# Altium footprint library Под микроконтроллеры.PcbLib: 24 footprints (part 1 of 2)
Each footprint in its own frame and in the unit in brackets; x right, y up, seen from the top. Pads: shape width x height; smd on the part's side, far side on the other; paste and mask are expansions set on the pad; w line width, h text height; cw(c..) or ccw(c..) is an arc to the next point about the centre after c.
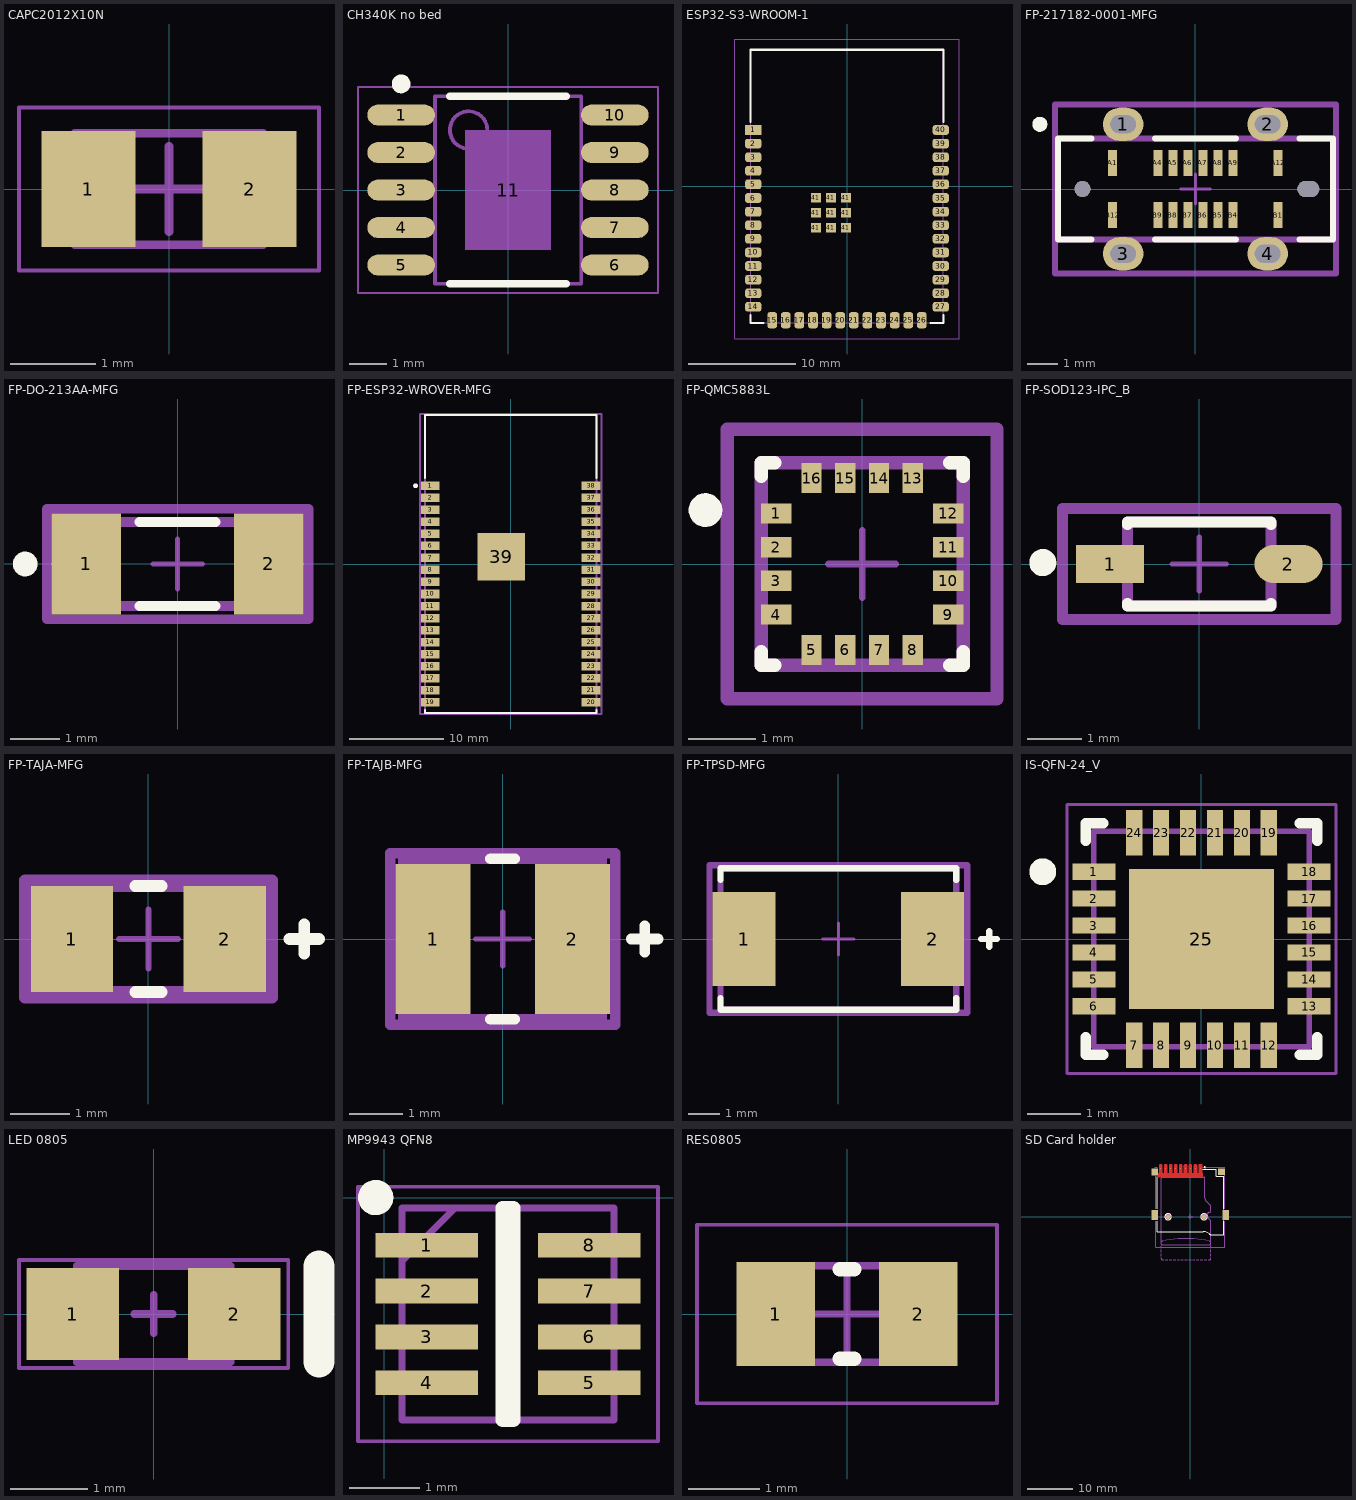
[diagram p0: the footprints below, top view; thin cyan lines are the x and y axes]

## CAPC2012X10N [mm] "Chip Capacitor, 2-Leads, Body 2,05x1,20mm, IPC Medium Density"
height 1
pads (2):
  rect 1.1x1.35 smd: 1(-0.94,0) 2(0.94,0)
Top Assembly:
  lines w0.1: -1.1,-0.65 -1.1,0.65 1.1,0.65 1.1,-0.65 -1.1,-0.65
Top Courtyard:
  lines w0.05: -1.75,-0.95 -1.75,0.95 1.75,0.95 1.75,-0.95 -1.75,-0.95
  lines w0.1: -0.5,0 0.5,0 ; 0,-0.5 0,0.5
3D body "CAPC2012X10N.step": height 1, standoff 0, extent -1.1,-0.65 1.1,0.65

## CH340K no bed [mm] "SOP, 10-Leads, Body 5,00x3,90mm, Pitch 1,00mm, Thermal Pad 3,20x2,30mm, IPC Medium Density"
height 2
pads (11):
  oval 1.8x0.56 smd: 1(-2.85,2) 2(-2.85,1) 3(-2.85,0) 4(-2.85,-1) 5(-2.85,-2) 6(2.85,-2) 7(2.85,-1) 8(2.85,0) 9(2.85,1) 10(2.85,2)
  rect 2.3x3.2 on Mech1: 11(0,0)
Top Overlay:
  circle w0.25: c-2.85,2.83 r0.125
  lines w0.2: -1.55,-2.5 1.55,-2.5 ; -1.55,2.5 1.55,2.5
Top 3D Body:
  circle w0.1: c-1.05,1.6 r0.5
  lines w0.1: -1.95,-2.5 -1.95,2.5 1.95,2.5 1.95,-2.5 -1.95,-2.5
Top Courtyard:
  lines w0.05: -4,-2.75 -4,2.75 4,2.75 4,-2.75 -4,-2.75
  lines w0.1: -0.5,0 0.5,0 ; 0,-0.5 0,0.5
3D body "SOP100P620X200_HS-11N.step": height 2, standoff 0, extent -3.075,-2.5 3.075,2.5

## ESP32-S3-WROOM-1 [mm] "PCB ANTENNA - 41 PIN"
pads (49):
  rect 1.5x0.9 smd: 1(-8.75,5.26)
  rrect50% 1.5x0.9 smd: 2(-8.75,3.99) 3(-8.75,2.72) 4(-8.75,1.45) 5(-8.75,0.18) 6(-8.75,-1.09) 7(-8.75,-2.36) 8(-8.75,-3.63) 9(-8.75,-4.9) 10(-8.75,-6.17) 11(-8.75,-7.44) 12(-8.75,-8.71) 13(-8.75,-9.98) 14(-8.75,-11.25) 27(8.75,-11.25) 28(8.75,-9.98) 29(8.75,-8.71) 30(8.75,-7.44) 31(8.75,-6.17) 32(8.75,-4.9) 33(8.75,-3.63) 34(8.75,-2.36) 35(8.75,-1.09) 36(8.75,0.18) 37(8.75,1.45) 38(8.75,2.72) 39(8.75,3.99) 40(8.75,5.26)
  rrect50% 0.9x1.5 smd: 15(-6.985,-12.5) 16(-5.715,-12.5) 17(-4.445,-12.5) 18(-3.175,-12.5) 19(-1.905,-12.5) 20(-0.635,-12.5) 21(0.635,-12.5) 22(1.905,-12.5) 23(3.175,-12.5) 24(4.445,-12.5) 25(5.715,-12.5) 26(6.985,-12.5)
  rect 0.9x0.9 smd: 41(-2.9,-3.86) 41(-2.9,-2.46) 41(-2.9,-1.06) 41(-1.5,-3.86) 41(-1.5,-2.46) 41(-1.5,-1.06) 41(-0.1,-3.86) 41(-0.1,-2.46) 41(-0.1,-1.06)
Top Overlay:
  lines w0.2: -9,-12 -9,-12.75 -7.8,-12.75 ; -9,6 -9,12.75 9,12.75 9,6 ; 7.8,-12.75 9,-12.75 9,-12
Top 3D Body:
  lines w0.1: -9,-12.75 9,-12.75 9,12.75 -9,12.75 -9,-12.75
Top Courtyard:
  lines w0.1: -10.5,-14.25 10.5,-14.25 10.5,13.75 -10.5,13.75 -10.5,-14.25
3D body "ESP32-S3-WROOM-1.STEP": height 3.1, standoff 0, extent -9,-12.75 9,12.75

## FP-217182-0001-MFG [mm]
pads (22):
  rrect100% 1.35x1.1 hole 0.6 slot 0.85 at 0 deg paste-2539.97 mask+0: 1(-2.4,2.15) 2(2.4,2.15) 3(-2.4,-2.15) 4(2.4,-2.15)
  rect 0.3x0.87 smd paste+0 mask+0: A1(-2.75,0.865) A4(-1.25,0.865) A5(-0.75,0.865) A6(-0.25,0.865) A7(0.25,0.865) A8(0.75,0.865) A9(1.25,0.865) A12(2.75,0.865) B1(2.75,-0.865) B4(1.25,-0.865) B5(0.75,-0.865) B6(0.25,-0.865) B7(-0.25,-0.865) B8(-0.75,-0.865) B9(-1.25,-0.865) B12(-2.75,-0.865)
  round 0.52 hole 0.52 unplated paste-2539.97 mask+0: ""(-3.75,0)
  rrect100% 0.72x0.52 hole 0.52 slot 0.72 at 0 deg unplated paste-2539.97 mask+0: ""(3.75,0)
Top Overlay:
  circle w0.25: c-5.17,2.15 r0.125
  lines w0.2: -3.45,-1.68 -4.57,-1.68 -4.57,1.68 -3.45,1.68 ; -1.35,-1.68 1.35,-1.68 ; -1.35,1.68 1.35,1.68 ; 3.45,-1.68 4.57,-1.68 4.57,1.68 3.45,1.68
Top Assembly:
  lines w0.2: -4.67,-2.8 4.67,-2.8 4.67,2.8 -4.67,2.8 -4.67,-2.8
  text ".Designator" at 0,0.188 h1
Top 3D Body:
  lines w0.2: -4.57,-1.68 4.57,-1.68 4.57,1.68 -4.57,1.68 -4.57,-1.68
Top Courtyard:
  lines w0.2: -4.67,-2.8 4.67,-2.8 4.67,2.8 -4.67,2.8 -4.67,-2.8
Top Component Center:
  lines w0.1: -0.5,0 0.5,0 ; 0,-0.5 0,0.5
3D body "Conn_Molex_217182-0001_eec.STEP": height 0.25, standoff 0, extent -4.67,-2.8 4.67,2.8

## FP-DO-213AA-MFG [mm]
pads (2):
  rect 1.4x2.03 smd paste+0 mask+0: 1(-1.84,0) 2(1.84,0)
Top Overlay:
  circle w0.25: c-3.075,0 r0.125
  lines w0.2: -0.765,-0.85 0.765,-0.85 ; -0.765,0.85 0.765,0.85
Top Assembly:
  lines w0.2: -2.64,-1.115 -2.64,1.115 2.64,1.115 2.64,-1.115 -2.64,-1.115
  text ".Designator" at 0.909,0.642 h1
Top 3D Body:
  lines w0.2: -1.855,-0.85 -1.855,0.85 1.855,0.85 1.855,-0.85 -1.855,-0.85
Top Courtyard:
  lines w0.2: -2.64,-1.115 -2.64,1.115 2.64,1.115 2.64,-1.115 -2.64,-1.115
Top Component Center:
  lines w0.1: -0.5,0 0.5,0 ; 0,-0.5 0,0.5
3D body "Diode_Microchip_JAN1N4148UR-1_eec.STEP": height 0.25, standoff 0, extent -2.64,-1.115 2.64,1.115

## FP-ESP32-WROVER-MFG [mm]
pads (39):
  rect 2x0.9 smd paste+0 mask+0: 1(-8.5,8.26) 2(-8.5,6.99) 3(-8.5,5.72) 4(-8.5,4.45) 5(-8.5,3.18) 6(-8.5,1.91) 7(-8.5,0.64) 8(-8.5,-0.63) 9(-8.5,-1.9) 10(-8.5,-3.17) 11(-8.5,-4.44) 12(-8.5,-5.71) 13(-8.5,-6.98) 14(-8.5,-8.25) 15(-8.5,-9.52) 16(-8.5,-10.79) 17(-8.5,-12.06) 18(-8.5,-13.33) 19(-8.5,-14.6) 20(8.5,-14.6) 21(8.5,-13.33) 22(8.5,-12.06) 23(8.5,-10.79) 24(8.5,-9.52) 25(8.5,-8.25) 26(8.5,-6.98) 27(8.5,-5.71) 28(8.5,-4.44) 29(8.5,-3.17) 30(8.5,-1.9) 31(8.5,-0.63) 32(8.5,0.64) 33(8.5,1.91) 34(8.5,3.18) 35(8.5,4.45) 36(8.5,5.72) 37(8.5,6.99) 38(8.5,8.26)
  rect 5x5 smd paste+0 mask+0: 39(-1,0.76)
Top Overlay:
  circle w0.25: c-10.05,8.26 r0.125
  lines w0.2: -9.05,-15.425 -9.05,-15.75 9.05,-15.75 9.05,-15.425 ; -9.05,9.085 -9.05,15.75 9.05,15.75 9.05,9.085
Top Assembly:
  lines w0.2: -9.6,-15.85 -9.6,15.85 9.6,15.85 9.6,-15.85 -9.6,-15.85
  text ".Designator" at 0,-0.001 h1
Top 3D Body:
  lines w0.2: -9.05,-15.75 -9.05,15.75 9.05,15.75 9.05,-15.75 -9.05,-15.75
Top Courtyard:
  lines w0.2: -9.6,-15.85 -9.6,15.85 9.6,15.85 9.6,-15.85 -9.6,-15.85
Top Component Center:
  lines w0.1: -0.5,0 0.5,0 ; 0,-0.5 0,0.5
3D body "UNK_Espressif_Systems_ESP32-WROVER_eec.STEP": height 0.25, standoff 0, extent -9.6,-15.85 9.6,15.85

## FP-QMC5883L [mm]
pads (16):
  rect 0.45x0.3 smd paste+0 mask+0: 1(-1.275,0.75) 2(-1.275,0.25) 3(-1.275,-0.25) 4(-1.275,-0.75) 9(1.275,-0.75) 10(1.275,-0.25) 11(1.275,0.25) 12(1.275,0.75)
  rect 0.3x0.45 smd paste+0 mask+0: 5(-0.75,-1.275) 6(-0.25,-1.275) 7(0.25,-1.275) 8(0.75,-1.275) 13(0.75,1.275) 14(0.25,1.275) 15(-0.25,1.275) 16(-0.75,1.275)
Top Overlay:
  circle w0.25: c-2.325,0.8 r0.125
  lines w0.2: -1.5,-1.3 -1.5,-1.5 -1.3,-1.5 ; -1.5,1.3 -1.5,1.5 -1.3,1.5 ; 1.3,-1.5 1.5,-1.5 1.5,-1.3 ; 1.3,1.5 1.5,1.5 1.5,1.3
Top Assembly:
  lines w0.2: -2,-2 -2,2 2,2 2,-2 -2,-2
Top 3D Body:
  lines w0.2: -1.5,-1.5 -1.5,1.5 1.5,1.5 1.5,-1.5 -1.5,-1.5
Top Courtyard:
  lines w0.2: -2,-2 -2,2 2,2 2,-2 -2,-2
Top Component Center:
  lines w0.1: -0.5,0 0.5,0 ; 0,-0.5 0,0.5
3D body "IC_Honeywell_HMC5883L-TR_eec.STEP": height 0.9, standoff 0, extent -1.5,-1.5 1.5,1.5

## FP-SOD123-IPC_B [mm]
pads (2):
  rect 1.257x0.702 smd paste+0 mask+0: 1(-1.65,0)
  rrect100% 1.257x0.702 smd paste+0 mask+0: 2(1.65,0)
Top Overlay:
  circle w0.25: c-2.895,0.026 r0.125
  lines w0.2: -1.325,-0.726 -1.325,-0.775 1.325,-0.775 1.325,-0.726 ; -1.325,0.726 -1.325,0.775 1.325,0.775 1.325,0.726
Top Assembly:
  lines w0.2: -2.529,-1.025 2.529,-1.025 2.529,1.025 -2.529,1.025 -2.529,-1.025
  text ".Designator" at 0,0.188 h1
Top 3D Body:
  lines w0.2: -1.325,-0.775 1.325,-0.775 1.325,0.775 -1.325,0.775 -1.325,-0.775
Top Courtyard:
  lines w0.2: -2.529,-1.025 2.529,-1.025 2.529,1.025 -2.529,1.025 -2.529,-1.025
Top Component Center:
  lines w0.1: -0.5,0 0.5,0 ; 0,-0.5 0,0.5
3D body "Diode_Diodes_Inc_MMSZ5245B-7-F_eec.STEP": height 0.25, standoff 0, extent -2.529,-1.025 2.529,1.025

## FP-TAJA-MFG [mm]
height 8.54
pads (2):
  rect 1.4x1.8 smd paste+0 mask+0: 1(-1.3,0) 2(1.3,0)
Top Overlay:
  lines w0.2: -0.225,-0.9 0.225,-0.9 ; -0.225,0.9 0.225,0.9 ; 2.4,0 2.9,0 ; 2.65,-0.25 2.65,0.25
Top Assembly:
  lines w0.2: -2.1,-1 2.1,-1 2.1,1 -2.1,1 -2.1,-1
  text ".Designator" at 0,-0.001 h1
Top 3D Body:
  lines w0.2: -1.7,-0.9 1.7,-0.9 1.7,0.9 -1.7,0.9 -1.7,-0.9
Top Courtyard:
  lines w0.2: -2.1,-1 2.1,-1 2.1,1 -2.1,1 -2.1,-1
Top Component Center:
  lines w0.1: -0.5,0 0.5,0 ; 0,-0.5 0,0.5
3D body "Cap_AVX_TAJA476K002RNJ_eec.STEP": height 0.25, standoff 0, extent -2.1,-1 2.1,1

## FP-TAJB-MFG [mm]
height 8.54
pads (2):
  rect 1.4x2.8 smd paste+0 mask+0: 1(-1.3,0) 2(1.3,0)
Top Overlay:
  lines w0.2: -0.225,-1.5 0.225,-1.5 ; -0.225,1.5 0.225,1.5 ; 2.4,0 2.9,0 ; 2.65,-0.25 2.65,0.25
Top Assembly:
  lines w0.2: -2.1,-1.6 -2.1,1.6 2.1,1.6 2.1,-1.6 -2.1,-1.6
  text ".Designator" at 0,-0.001 h1
Top 3D Body:
  lines w0.2: -1.85,-1.5 -1.85,1.5 1.85,1.5 1.85,-1.5 -1.85,-1.5
Top Courtyard:
  lines w0.2: -2.1,-1.6 -2.1,1.6 2.1,1.6 2.1,-1.6 -2.1,-1.6
Top Component Center:
  lines w0.1: -0.5,0 0.5,0 ; 0,-0.5 0,0.5
3D body "Cap_AVX_TAJB335M035RNJ_eec.STEP": height 0.25, standoff 0, extent -2.1,-1.6 2.1,1.6

## FP-TPSD-MFG [mm]
pads (2):
  rect 2x3 smd paste+0 mask+0: 1(-3,0) 2(3,0)
Top Overlay:
  lines w0.2: -3.75,-1.875 -3.75,-2.25 3.75,-2.25 3.75,-1.875 ; -3.75,1.875 -3.75,2.25 3.75,2.25 3.75,1.875 ; 4.55,0 5.05,0 ; 4.8,-0.25 4.8,0.25
Top Assembly:
  lines w0.2: -4.1,-2.35 4.1,-2.35 4.1,2.35 -4.1,2.35 -4.1,-2.35
  text ".Designator" at 0,-0.001 h1
Top 3D Body:
  lines w0.2: -3.75,-2.25 3.75,-2.25 3.75,2.25 -3.75,2.25 -3.75,-2.25
Top Courtyard:
  lines w0.2: -4.1,-2.35 4.1,-2.35 4.1,2.35 -4.1,2.35 -4.1,-2.35
Top Component Center:
  lines w0.1: -0.5,0 0.5,0 ; 0,-0.5 0,0.5
3D body "Cap_AVX_TPSD476K016R0150_eec.STEP": height 0.25, standoff 0, extent -4.1,-2.35 4.1,2.35

## IS-QFN-24_V [mm] "QFN, 24-Leads, Body 4x4mm, Pitch 0.5mm, Thermal Pad 2.7x2.6mm"
height 0.95
pads (25):
  rect 0.8x0.3 smd: 1(-2,1.25) 2(-2,0.75) 3(-2,0.25) 4(-2,-0.25) 5(-2,-0.75) 6(-2,-1.25) 13(2,-1.25) 14(2,-0.75) 15(2,-0.25) 16(2,0.25) 17(2,0.75) 18(2,1.25)
  rect 0.3x0.85 smd mask+0.102: 7(-1.25,-1.975) 8(-0.75,-1.975) 9(-0.25,-1.975) 10(0.25,-1.975) 11(0.75,-1.975) 12(1.25,-1.975) 19(1.25,1.975) 20(0.75,1.975) 21(0.25,1.975) 22(-0.25,1.975) 23(-0.75,1.975) 24(-1.25,1.975)
  rect 2.7x2.6 smd: 25(0,0)
Top Overlay:
  circle w0.25: c-2.95,1.25 r0.125
  lines w0.2: -2.15,-1.825 -2.15,-2.15 -1.825,-2.15 ; -2.15,1.825 -2.15,2.15 -1.825,2.15 ; 1.825,-2.15 2.15,-2.15 2.15,-1.825 ; 1.825,2.15 2.15,2.15 2.15,1.825
Top 3D Body:
  lines w0.1: -2,-2 2,-2 2,2 -2,2 -2,-2
Top Courtyard:
  lines w0.05: -2.5,-2.5 -2.5,2.5 2.5,2.5 2.5,-2.5 -2.5,-2.5
  lines w0.1: -0.5,0 0.5,0 ; 0,-0.5 0,0.5
3D body: height 0.95, standoff 0, extent -1.999,-1.999 1.999,1.999

## LED 0805 [mm] "SMD, 2-Leads, Body 2x1.25mm, Height 0.8mm"
height 0.8
pads (2):
  rect 1.2x1.2 smd: 1(-1.05,0) 2(1.05,0)
Top Overlay:
  lines w0.4: 2.15,-0.625 2.15,0.625
Top 3D Body:
  lines w0.1: -0.25,0.625 -1,0.625 ; -1,0.625 -1,-0.625 1,-0.625 1,0.625 -1,0.625
Top Courtyard:
  lines w0.05: -1.75,-0.7 1.75,-0.7 1.75,0.7 -1.75,0.7 -1.75,-0.7
  lines w0.1: -0.25,0 0.25,0 ; 0,-0.25 0,0.25
3D body: height 0.8, standoff 0, extent -0.7,-0.625 0.7,0.625
3D body: height 0.3, standoff 0, extent -1,-0.625 1,0.625

## MP9943 QFN8 [mm]
pads (8):
  rect 1.45x0.35 smd: 1(0.6,-0.675) 2(0.6,-1.325) 3(0.6,-1.975) 4(0.6,-2.625) 5(2.9,-2.625) 6(2.9,-1.975) 7(2.9,-1.325) 8(2.9,-0.675)
Top Overlay:
  circle w0.25: c-0.125,0 r0.125
  lines w0.2: 1.675,-3.15 1.675,-0.15 1.825,-0.15 1.825,-3.15 1.675,-3.15
Top 3D Body:
  lines w0.1: 0.25,-0.9 1,-0.15 ; 0.25,-3.15 0.25,-0.15 3.25,-0.15 3.25,-3.15 0.25,-3.15
Top Courtyard:
  lines w0.05: -0.375,-3.45 -0.375,0.15 3.875,0.15 3.875,-3.45 -0.375,-3.45
3D body "MP9943AGQ-Z.stp": height 1, standoff 0, extent 0.2,-3.15 3.3,-0.15

## RES0805 [mm] "Chip Resistor, 2-Leads, Body 2.1x1.35mm, IPC Low Density"
height 0.6
pads (2):
  rect 1.1x1.45 smd: 1(-1,0) 2(1,0)
Top Overlay:
  lines w0.2: -0.1,-0.625 0.1,-0.625 ; -0.1,0.625 0.1,0.625
Top 3D Body:
  lines w0.1: -1.05,-0.675 1.05,-0.675 1.05,0.675 -1.05,0.675 -1.05,-0.675
Top Courtyard:
  lines w0.05: -2.1,-1.25 2.1,-1.25 2.1,1.25 -2.1,1.25 -2.1,-1.25
  lines w0.1: -0.5,0 0.5,0 ; 0,-0.5 0,0.5
3D body "RESC2012X06N.step": height 0.6, standoff 0, extent -1.05,-0.675 1.05,0.675

## SD Card holder [mm] "Micro SD Card, TF Card, Memory Card Connector, 9-Leads, Body 16.44x15.6 mm, 1.4mm Profile SMT, Push-Push (MEM2055/MEM2075)"
height 1.85
pads (15):
  round 1 smd: 0(-4.93,0) 0(3.05,0)
  round 0.025 smd: 1(2.25,10.7) 2(1.15,10.7) 3(0,10.7) 4(-1.05,10.7) 5(-2.15,10.7) 6(-3.25,10.7) 7(-4.35,10.7) 8(-5.45,10.7) 9(-6.55,10.7)
  rect 1.4x2.2 smd: SH(-7.9,0.4) SH(7.9,0.4)
  rect 1.4x1.6 smd: SH(-7.9,9.9)
  rect 1.6x1.4 smd: SH(6.9,10)
Top Layer:
  circle w0.254: c3.05,0 r0.5
  circle w0.254: c-4.93,0 r0.5
  pour cut-out: -7.15,9.7 2.794,9.7 2.794,8.8 -7.15,8.8
  region: 2.6,9.7 1.9,9.7 1.9,11.613 1.9,11.63 1.913,11.662 1.938,11.687 1.97,11.7 1.987,11.7 2.513,11.7 2.53,11.7 2.562,11.687 2.587,11.662 2.6,11.63 2.6,11.613
  region: 1.5,9.7 0.8,9.7 0.8,11.35 0.8,11.384 0.813,11.452 0.84,11.516 0.878,11.573 0.927,11.622 0.984,11.66 1.048,11.687 1.116,11.7 1.15,11.7 1.184,11.7 1.252,11.687 1.316,11.66 1.373,11.622 1.422,11.573 1.46,11.516 1.487,11.452 1.5,11.384 1.5,11.35
  region: 0.35,9.7 -0.35,9.7 -0.35,11.35 -0.35,11.384 -0.337,11.452 -0.31,11.516 -0.272,11.573 -0.223,11.622 -0.166,11.66 -0.102,11.687 -0.034,11.7 0,11.7 0.034,11.7 0.102,11.687 0.166,11.66 0.223,11.622 0.272,11.573 0.31,11.516 0.337,11.452 0.35,11.384 0.35,11.35
  region: -0.7,9.7 -1.4,9.7 -1.4,11.35 -1.4,11.384 -1.387,11.452 -1.36,11.516 -1.322,11.573 -1.273,11.622 -1.216,11.66 -1.152,11.687 -1.084,11.7 -1.05,11.7 -1.016,11.7 -0.948,11.687 -0.884,11.66 -0.827,11.622 -0.778,11.573 -0.74,11.516 -0.713,11.452 -0.7,11.384 -0.7,11.35
  region: -1.8,9.7 -2.5,9.7 -2.5,11.35 -2.5,11.384 -2.487,11.452 -2.46,11.516 -2.422,11.573 -2.373,11.622 -2.316,11.66 -2.252,11.687 -2.184,11.7 -2.15,11.7 -2.116,11.7 -2.048,11.687 -1.984,11.66 -1.927,11.622 -1.878,11.573 -1.84,11.516 -1.813,11.452 -1.8,11.384 -1.8,11.35
  region: -2.9,9.7 -3.6,9.7 -3.6,11.35 -3.6,11.384 -3.587,11.452 -3.56,11.516 -3.522,11.573 -3.473,11.622 -3.416,11.66 -3.352,11.687 -3.284,11.7 -3.25,11.7 -3.216,11.7 -3.148,11.687 -3.084,11.66 -3.027,11.622 -2.978,11.573 -2.94,11.516 -2.913,11.452 -2.9,11.384 -2.9,11.35
  region: -4,9.7 -4.7,9.7 -4.7,11.35 -4.7,11.384 -4.687,11.452 -4.66,11.516 -4.622,11.573 -4.573,11.622 -4.516,11.66 -4.452,11.687 -4.384,11.7 -4.35,11.7 -4.316,11.7 -4.248,11.687 -4.184,11.66 -4.127,11.622 -4.078,11.573 -4.04,11.516 -4.013,11.452 -4,11.384 -4,11.35
  region: -5.1,9.7 -5.8,9.7 -5.8,11.35 -5.8,11.384 -5.787,11.452 -5.76,11.516 -5.722,11.573 -5.673,11.622 -5.616,11.66 -5.552,11.687 -5.484,11.7 -5.45,11.7 -5.416,11.7 -5.348,11.687 -5.284,11.66 -5.227,11.622 -5.178,11.573 -5.14,11.516 -5.113,11.452 -5.1,11.384 -5.1,11.35
  region: -6.2,9.7 -6.9,9.7 -6.9,11.35 -6.9,11.384 -6.887,11.452 -6.86,11.516 -6.822,11.573 -6.773,11.622 -6.716,11.66 -6.652,11.687 -6.584,11.7 -6.55,11.7 -6.516,11.7 -6.448,11.687 -6.384,11.66 -6.327,11.622 -6.278,11.573 -6.24,11.516 -6.213,11.452 -6.2,11.384 -6.2,11.35
Top Layer keep-out:
  circle w0.254: c-4.93,0 r0.5
  circle w0.254: c3.05,0 r0.5
Top Overlay:
  circle w0.2: c-4.93,0 r0.7
  circle w0.2: c3.05,0 r0.7
  circle w0.24: c3.25,11.02 r0.12
  lines w0.2: -7.375,-1 -7.375,-3.3 2.91,-3.3 cw(c2.91,-5.074) 4.165,-3.82 ccw(c4.6,-3.384) 4.6,-4 7.375,-4 7.375,-0.9 ; -7.375,1.8 -7.375,8.922 ; 2.8,10.5 5.8,10.5 5.8,9 7.375,9 7.375,1.7
Top 3D Body:
  lines w0.125: -6.45,-9.057 -6.45,-9.246 ccw(c-6.196,-9.246) -6.196,-9.5 -5.85,-9.5 ; -6.45,-8.717 -6.45,-8.197 ; -6.45,-7.857 -6.45,-7.337 ; -6.45,-6.997 -6.45,-6.477 ; -5.51,-9.5 -4.99,-9.5 ; -4.65,-9.5 -4.13,-9.5 ; -3.79,-9.5 -3.27,-9.5 ; -2.93,-9.5 -2.41,-9.5 ; -2.07,-9.5 -1.55,-9.5 ; -1.21,-9.5 -0.69,-9.5 ; -0.35,-9.5 0.17,-9.5 ; 0.51,-9.5 1.03,-9.5 ; 1.37,-9.5 1.89,-9.5 ; 2.23,-9.5 2.75,-9.5 ; 3.09,-9.5 3.61,-9.5 ; 3.95,-9.5 4.296,-9.5 ccw(c4.296,-9.246) 4.55,-9.246 4.55,-9.057 ; 4.55,-8.717 4.55,-8.197 ; 4.55,-7.857 4.55,-7.337 ; 4.55,-6.997 4.55,-6.477
  lines w0.2: -6.437,-5.553 cw(c-6.027,-5.964) -6.148,-5.396 cw(c-0.95,-29.85) 4.248,-5.396 cw(c4.127,-5.964) 4.537,-5.553 ; 3.85,-0.022 3.85,0.696 cw(c4.104,0.696) 4.104,0.95 4.296,0.95 ccw(c4.296,1.204) 4.55,1.204 4.55,2.24 ccw(c4.042,2.24) 4.401,2.599 3.55,3.45 cw(c4.274,4.174) 3.25,4.174 3.25,8.546 ccw(c2.996,8.546) 2.996,8.8 -6.196,8.8 ccw(c-6.196,8.546) -6.45,8.546 -6.45,-5.946 ccw(c-6.196,-5.946) -6.196,-6.2 4.296,-6.2 ccw(c4.296,-5.946) 4.55,-5.946 4.55,-4 4.55,-1.11 ; 3.85,0.01 ccw(c4.358,0.01) 3.999,-0.349 4.401,-0.751 cw(c4.042,-1.11) 4.55,-1.11 ; 4.55,-1.11 ccw(c4.55,-1.11) 4.55,-1.11
Top Courtyard:
  lines w0.1: -7.75,10.77 -7.75,11.02 -7.28,11.02 ; -7.7,-1 -7.7,-6.731 7.7,-6.731 7.7,-0.98 ; -7.7,1.72 -7.7,9.03 ; -0.5,0 0.5,0 ; 0,-0.5 0,0.5 ; 2.82,11.02 7.7,11.02 7.7,10.84 ; 7.7,1.74 7.7,9.16
3D body "User Library-MEM2055-00-190-01-A_revG.STEP": height 1.9, standoff -0.55, extent -7.952,-3.978 8.048,11.272
3D body "MicroSD.step": height 1.9, standoff -0.55, extent -8.001,-6.261 7.999,11.27